# Altium footprint library ESKDPcbLib.PcbLib: 608 footprints (part 36 of 38)
Each footprint in its own frame and in the unit in brackets; x right, y up, seen from the top. Pads: shape width x height; smd on the part's side, far side on the other; paste and mask are expansions set on the pad; w line width, h text height; cw(c..) or ccw(c..) is an arc to the next point about the centre after c.
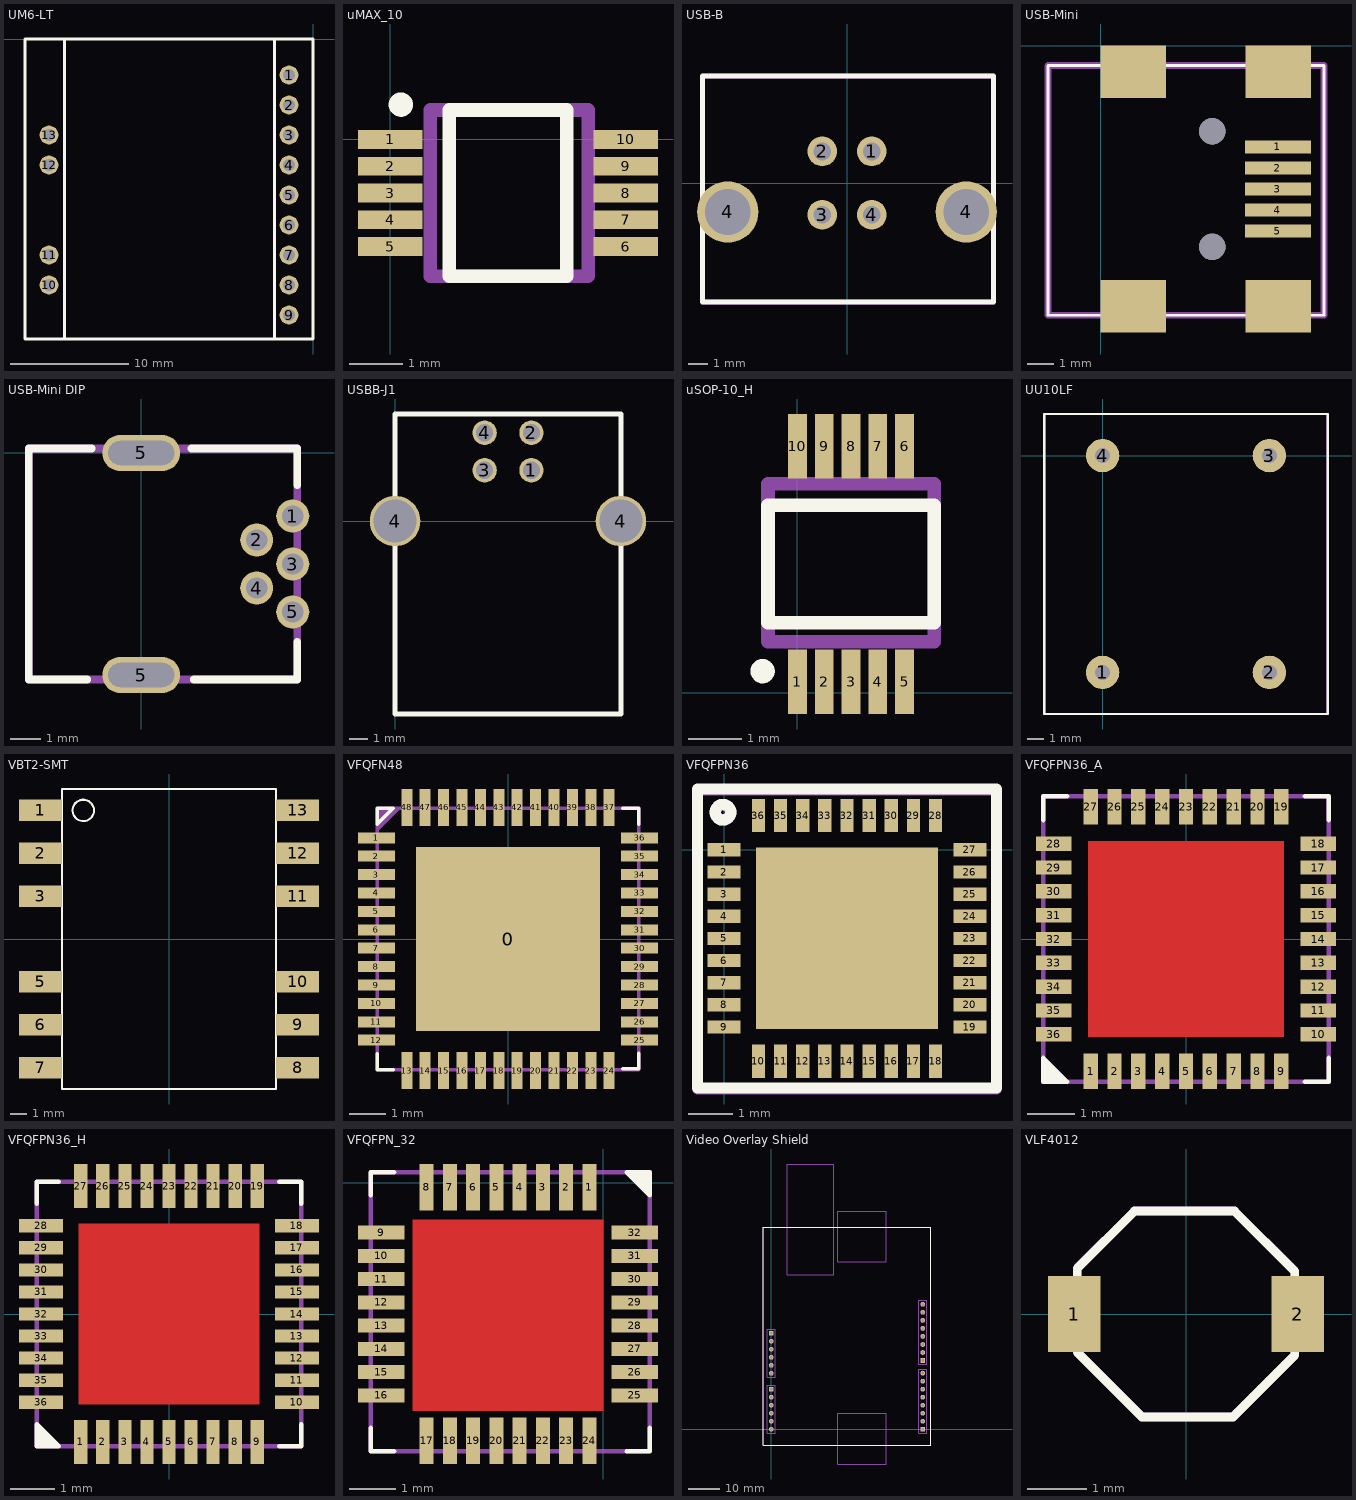
[diagram p35: the footprints below, top view; thin cyan lines are the x and y axes]

## UM6-LT [mm]
pads (13):
  round 1.6 hole 1 mask+0: 1(-2.032,-3.048) 2(-2.032,-5.588) 3(-2.032,-8.128) 4(-2.032,-10.668) 5(-2.032,-13.208) 6(-2.032,-15.748) 7(-2.032,-18.288) 8(-2.032,-20.828) 9(-2.032,-23.368) 10(-22.352,-20.828) 11(-22.352,-18.288) 12(-22.352,-10.668) 13(-22.352,-8.128)
Top Overlay:
  lines w0.254: -21.05,-25.4 -21.05,0 ; -3.27,-25.4 -3.27,0 ; -24.384,-25.4 -24.384,0 0,0 0,-25.4 -24.384,-25.4
3D body: height 8, standoff 2, extent -24.384,-25.4 0,0

## uMAX_10 [mm]
pads (10):
  rect 1.2x0.35 smd mask+0: 1(0,0) 2(0,-0.5) 3(0,-1) 4(0,-1.5) 5(0,-2) 6(4.4,-2) 7(4.4,-1.5) 8(4.4,-1) 9(4.4,-0.5) 10(4.4,0)
Top Overlay:
  circle w0.254: c0.2,0.65 r0.1
  lines w0.254: 1.1,-2.55 1.1,0.55 3.3,0.55 3.3,-2.55 1.1,-2.55
Mechanical 7:
  lines w0.254: 0.75,-2.55 0.75,0.55 ; 0.8,-2.55 3.7,-2.55 3.7,0.55 0.8,0.55
3D body: height 0.95, standoff 0, extent -0.3,-2.5 4.7,0.5

## USB-B [mm]
pads (6):
  round 1.5 hole 0.9: 1(1.25,1.6) 2(-1.25,1.6) 3(-1.25,-1.6) 4(1.25,-1.6)
  round 3.1 hole 2.3: 4(-6.02,-1.46) 4(6.02,-1.46)
Top Overlay:
  lines w0.254: -7.3,-6 7.4,-6 7.4,5.4 -7.3,5.4 -7.3,-6
Mechanical 7:
  lines w0.254: -7.3,-6 7.4,-6 7.4,5.4 -7.3,5.4 -7.3,-6
Mechanical 10:
  text ".Designator" at -3.2,6.8 h1.52
  text ".Comment" at -2.6,8.6 h1.52
3D body "USB-B.stp": height 16, standoff -3.95, extent -7.3,-5.925 7.4,5.375

## USB-Mini [mm]
pads (11):
  rect 2.5x0.5 smd: 1(6.75,-3.85) 2(6.75,-4.65) 3(6.75,-5.45) 4(6.75,-6.25) 5(6.75,-7.05)
  rect 2.5x2 smd: ""(1.245,-9.906) ""(1.245,-0.991) ""(6.756,-9.906) ""(6.756,-0.991)
  round 1 hole 1 mask+0: ""(4.25,-7.65) ""(4.25,-3.25)
Top Overlay:
  lines w0.1: -2,-10.25 -2,-0.75 8.5,-0.75 8.5,-10.25 -2,-10.25
Mechanical 7:
  lines w0.254: -2,-10.25 8.5,-10.25 8.5,-0.75 -2,-0.75 -2,-10.25
3D body "USBmini_smt.stp": height 4, standoff -0.9, extent -2.06,-10.33 7.34,-0.67

## USB-Mini DIP [mm]
height 3.9
pads (7):
  round 1.1 hole 0.7: 1(5.05,-2.1) 2(3.85,-2.9) 3(5.05,-3.7) 4(3.85,-4.5) 5(5.05,-5.3)
  oval 2.6x1.2 hole 0.8 slot 2.2 at 0 deg: 5(0,-7.4) 5(0,0)
Top Overlay:
  lines w0.254: -1.8,-7.55 -3.75,-7.55 -3.75,0.15 -1.65,0.15 ; 1.675,0.15 5.2,0.15 5.2,-1.075 ; 1.75,-7.55 5.2,-7.55 5.2,-6.3
Mechanical 7:
  lines w0.254: -3.75,-7.55 -3.75,0.15 5.2,0.15 5.2,-7.55 -3.75,-7.55
3D body: height 3.9, standoff 0, extent -3.749,-7.549 5.199,0.149

## USBB-J1 [mm]
pads (6):
  round 1.3 hole 0.92: 1(7.27,2.71) 2(7.27,4.71) 3(4.77,2.71) 4(4.77,4.71)
  round 2.7 hole 2.3: 4(0,0) 4(12.04,0)
Top Overlay:
  lines w0.254: 12,5.71 0,5.71 0,-10.29 12.04,-10.29 12.04,5.71

## uSOP-10_H [mm]
pads (10):
  rect 0.35x1.2 smd mask+0: 1(0,0.2) 2(0.5,0.2) 3(1,0.2) 4(1.5,0.2) 5(2,0.2) 6(2,4.6) 7(1.5,4.6) 8(1,4.6) 9(0.5,4.6) 10(0,4.6)
Top Overlay:
  circle w0.254: c-0.65,0.4 r0.1
  lines w0.254: -0.55,1.3 -0.55,3.5 2.55,3.5 2.55,1.3 -0.55,1.3
Mechanical 7:
  lines w0.254: -0.55,0.95 2.55,0.95 ; -0.55,1 -0.55,3.9 2.55,3.9 2.55,1
3D body: height 1.15, standoff 0, extent -0.5,-0.05 2.5,4.85

## UU10LF [mm]
pads (4):
  round 2 hole 0.9: 1(0,-13) 2(10,-13) 3(10,0) 4(0,0)
Top Overlay:
  lines w0.15: -3.5,-15.5 -3.5,2.5 13.5,2.5 13.5,-15.5 -3.5,-15.5
Mechanical 7:
  lines w0.15: -3.5,-15.5 13.5,-15.5 13.5,2.5 -3.5,2.5 -3.5,-15.5
Mechanical 10:
  text ".Comment" at 9,3.5 h0.6
  text ".Designator" at 8.8,4.425 h0.8
3D body: height 23, standoff 0, extent -3.5,-15.5 13.5,2.5

## VBT2-SMT [mm]
pads (12):
  rect 2.54x1.27 smd: 1(-7.62,7.62) 2(-7.62,5.08) 3(-7.62,2.54) 5(-7.62,-2.54) 6(-7.62,-5.08) 7(-7.62,-7.62) 8(7.62,-7.62) 9(7.62,-5.08) 10(7.62,-2.54) 11(7.62,2.54) 12(7.62,5.08) 13(7.62,7.62)
Top Overlay:
  circle w0.127: c-5.08,7.62 r0.635
  lines w0.127: -6.35,-8.89 6.35,-8.89 6.35,8.89 -6.35,8.89 -6.35,-8.89

## VFQFN48 [mm]
height 1
pads (49):
  rect 5x5 smd: 0(0,0)
  rect 1x0.3 smd: 1(-3.575,2.75) 2(-3.575,2.25) 3(-3.575,1.75) 4(-3.575,1.25) 5(-3.575,0.75) 6(-3.575,0.25) 7(-3.575,-0.25) 8(-3.575,-0.75) 9(-3.575,-1.25) 10(-3.575,-1.75) 11(-3.575,-2.25) 12(-3.575,-2.75) 25(3.575,-2.75) 26(3.575,-2.25) 27(3.575,-1.75) 28(3.575,-1.25) 29(3.575,-0.75) 30(3.575,-0.25) 31(3.575,0.25) 32(3.575,0.75) 33(3.575,1.25) 34(3.575,1.75) 35(3.575,2.25) 36(3.575,2.75)
  rect 0.3x1 smd: 13(-2.75,-3.575) 14(-2.25,-3.575) 15(-1.75,-3.575) 16(-1.25,-3.575) 17(-0.75,-3.575) 18(-0.25,-3.575) 19(0.25,-3.575) 20(0.75,-3.575) 21(1.25,-3.575) 22(1.75,-3.575) 23(2.25,-3.575) 24(2.75,-3.575) 37(2.75,3.575) 38(2.25,3.575) 39(1.75,3.575) 40(1.25,3.575) 41(0.75,3.575) 42(0.25,3.575) 43(-0.25,3.575) 44(-0.75,3.575) 45(-1.25,3.575) 46(-1.75,3.575) 47(-2.25,3.575) 48(-2.75,3.575)
Top Overlay:
  lines w0.1: -3.55,-3.125 -3.55,-3.55 -3.125,-3.55 ; 3.125,-3.525 3.55,-3.525 3.55,-3.1 ; 3.125,3.55 3.55,3.55 3.55,3.125 ; -3.55,3.125 -3.55,3.55 -3.125,3.55 -3.55,3.125
Mechanical 7:
  lines w0.1: -3.546,2.979 -2.987,3.538 ; -3.542,3.108 -3.1,3.55 ; -3.542,3.208 -3.213,3.537 ; -3.542,3.396 -3.4,3.537 -3.375,3.512 ; -3.517,3.333 -3.338,3.512 ; -3.55,-3.55 -3.55,3.55 3.55,3.55 3.55,-3.55 -3.55,-3.55
Mechanical 10:
  text ".Comment" at -1.275,4.375 h0.6
  text ".Designator" at -1.225,-4.925 h0.6
3D body: height 1, standoff 0, extent -3.6,-3.6 3.6,3.6

## VFQFPN36 [mm]
pads (37):
  rect 0.75x0.3 smd: 1(0,0) 2(0,-0.5) 3(0,-1) 4(0,-1.5) 5(0,-2) 6(0,-2.5) 7(0,-3) 8(0,-3.5) 9(0,-4) 19(5.55,-4) 20(5.55,-3.5) 21(5.55,-3) 22(5.55,-2.5) 23(5.55,-2) 24(5.55,-1.5) 25(5.55,-1) 26(5.55,-0.5) 27(5.55,0)
  rect 0.3x0.75 smd: 10(0.775,-4.775) 11(1.275,-4.775) 12(1.775,-4.775) 13(2.275,-4.775) 14(2.775,-4.775) 15(3.275,-4.775) 16(3.775,-4.775) 17(4.275,-4.775) 18(4.775,-4.775) 28(4.775,0.775) 29(4.275,0.775) 30(3.775,0.775) 31(3.275,0.775) 32(2.775,0.775) 33(2.275,0.775) 34(1.775,0.775) 35(1.275,0.775) 36(0.775,0.775)
  rect 4.1x4.1 smd: ""(2.775,-2)
Top Overlay:
  circle w0.254: c-0.025,0.85 r0.175
  lines w0.25: -0.6,-5.375 6.15,-5.375 6.15,1.375 -0.6,1.375 -0.6,-5.375
Mechanical 7:
  circle w0.254: c-0.025,0.85 r0.175
  lines w0.25: -0.6,-5.4 -0.6,1.35 6.15,1.35 6.15,-5.4 -0.6,-5.4
3D body: height 1, standoff 0.05, extent -0.287,-5.062 5.838,1.063

## VFQFPN36_A [mm]
height 1
pads (36):
  rect 0.3x0.75 smd mask+0: 1(-2,-2.775) 2(-1.5,-2.775) 3(-1,-2.775) 4(-0.5,-2.775) 5(0,-2.775) 6(0.5,-2.775) 7(1,-2.775) 8(1.5,-2.775) 9(2,-2.775) 19(2,2.775) 20(1.5,2.775) 21(1,2.775) 22(0.5,2.775) 23(0,2.775) 24(-0.5,2.775) 25(-1,2.775) 26(-1.5,2.775) 27(-2,2.775)
  rect 0.75x0.3 smd mask+0: 10(2.775,-2) 11(2.775,-1.5) 12(2.775,-1) 13(2.775,-0.5) 14(2.775,0) 15(2.775,0.5) 16(2.775,1) 17(2.775,1.5) 18(2.775,2) 28(-2.775,2) 29(-2.775,1.5) 30(-2.775,1) 31(-2.775,0.5) 32(-2.775,0) 33(-2.775,-0.5) 34(-2.775,-1) 35(-2.775,-1.5) 36(-2.775,-2)
Top Layer:
  region: -2.05,2.05 2.05,2.05 2.05,-2.05 -2.05,-2.05
Top Overlay:
  region: -3,-3 -2.5,-3 -3,-2.5
  lines w0.1: -3,2.5 -3,3 -2.5,3 ; 2.5,-3 3,-3 3,-2.5 ; 2.5,3 3,3 3,2.5 ; -3,-3 -3,-2.5 -2.5,-3 -3,-3
Mechanical 7:
  lines w0.1: -3,-3 3,-3 3,3 -3,3 -3,-3
Mechanical 10:
  text ".Comment" at -1,-3.875 h0.6
  text ".Designator" at -1.075,3.6 h0.8
3D body: height 1, standoff 0, extent -3,-3 3,3

## VFQFPN36_H [mm]
height 1
pads (36):
  rect 0.3x1 smd mask+0: 1(-2,-2.9) 2(-1.5,-2.9) 3(-1,-2.9) 4(-0.5,-2.9) 5(0,-2.9) 6(0.5,-2.9) 7(1,-2.9) 8(1.5,-2.9) 9(2,-2.9) 19(2,2.9) 20(1.5,2.9) 21(1,2.9) 22(0.5,2.9) 23(0,2.9) 24(-0.5,2.9) 25(-1,2.9) 26(-1.5,2.9) 27(-2,2.9)
  rect 1x0.3 smd mask+0: 10(2.9,-2) 11(2.9,-1.5) 12(2.9,-1) 13(2.9,-0.5) 14(2.9,0) 15(2.9,0.5) 16(2.9,1) 17(2.9,1.5) 18(2.9,2) 28(-2.9,2) 29(-2.9,1.5) 30(-2.9,1) 31(-2.9,0.5) 32(-2.9,0) 33(-2.9,-0.5) 34(-2.9,-1) 35(-2.9,-1.5) 36(-2.9,-2)
Top Layer:
  region: -2.05,2.05 2.05,2.05 2.05,-2.05 -2.05,-2.05
Top Overlay:
  region: -3,-3 -2.5,-3 -3,-2.5
  lines w0.1: -3,2.5 -3,3 -2.5,3 ; 2.5,-3 3,-3 3,-2.5 ; 2.5,3 3,3 3,2.5 ; -3,-3 -3,-2.5 -2.5,-3 -3,-3
Mechanical 7:
  lines w0.1: -3,-3 3,-3 3,3 -3,3 -3,-3
Mechanical 10:
  text ".Comment" at -1,-3.875 h0.6
  text ".Designator" at -1.05,3.6 h0.8
3D body: height 1, standoff 0, extent -3,-3 3,3

## VFQFPN_32 [mm]
pads (32):
  rect 0.3x1 smd mask+0: 1(-0.3,-0.1) 2(-0.8,-0.1) 3(-1.3,-0.1) 4(-1.8,-0.1) 5(-2.3,-0.1) 6(-2.8,-0.1) 7(-3.3,-0.1) 8(-3.8,-0.1) 17(-3.8,-5.55) 18(-3.3,-5.55) 19(-2.8,-5.55) 20(-2.3,-5.55) 21(-1.8,-5.55) 22(-1.3,-5.55) 23(-0.8,-5.55) 24(-0.3,-5.55)
  rect 1x0.3 smd mask+0: 9(-4.775,-1.075) 10(-4.775,-1.575) 11(-4.775,-2.075) 12(-4.775,-2.575) 13(-4.775,-3.075) 14(-4.775,-3.575) 15(-4.775,-4.075) 16(-4.775,-4.575) 25(0.675,-4.575) 26(0.675,-4.075) 27(0.675,-3.575) 28(0.675,-3.075) 29(0.675,-2.575) 30(0.675,-2.075) 31(0.675,-1.575) 32(0.675,-1.075)
Top Layer:
  region: -4.1,-0.8 0,-0.8 0,-4.9 -4.1,-4.9
Top Overlay:
  region: 1,0.225 0.5,0.225 1,-0.275
  lines w0.1: -5,-5.275 -5,-5.775 -4.5,-5.775 ; -5,-0.275 -5,0.225 -4.5,0.225 ; 0.5,-5.775 1,-5.775 1,-5.275 ; 0.5,0.225 1,0.225 1,-0.275 0.5,0.225
Mechanical 7:
  lines w0.1: -5,-5.775 1,-5.775 1,0.225 -5,0.225 -5,-5.775
Mechanical 10:
  text ".Comment" at -3.302,-6.604 h0.6
  text ".Designator" at -3.302,0.762 h0.6
3D body: height 1, standoff 0, extent -4.55,-5.275 0.45,-0.275

## Video Overlay Shield [mm]
pads (28):
  rect 1.5x1.5 hole 0.9: 1(0,30.4) 7(0,12.7) 13(48,0) 21(48,21.775)
  round 1.5 hole 0.9: 2(0,27.86) 3(0,25.32) 4(0,22.78) 5(0,20.24) 6(0,17.7) 8(0,10.16) 9(0,7.62) 10(0,5.08) 11(0,2.54) 12(0,0) 14(48,2.54) 15(48,5.08) 16(48,7.62) 17(48,10.16) 18(48,12.7) 19(48,15.24) 20(48,17.78) 22(48,24.315) 23(48,26.855) 24(48,29.395) 25(48,31.935) 26(48,34.475) 27(48,37.015) 28(48,39.555)
Top Overlay:
  lines w0.15: -2.5,-5 50.5,-5 50.5,64 -2.5,64 -2.5,-5
Mechanical 7:
  lines w0.1: -2.5,-5 -2.5,64 50.5,64 50.5,-5 -2.5,-5 ; -1.3,-1.2 1.3,-1.2 1.3,14 -1.3,14 -1.3,-1.2 ; -1.3,16.5 -1.3,31.7 1.3,31.7 1.3,16.5 -1.3,16.5 ; 5,49 19.8,49 19.8,84 5,84 5,49 ; 21,-11 21,5 36.5,5 36.5,-11 21,-11 ; 21,53 36.5,53 36.5,69 21,69 21,53 ; 46.7,-1.2 49.3,-1.2 49.3,19 46.7,19 46.7,-1.2 ; 46.7,20.575 49.3,20.575 49.3,40.9 46.7,40.9 46.7,20.575
3D body: height 11, standoff 3, extent 46.7,20.575 49.3,40.9
3D body: height 11, standoff 3, extent 46.7,-1.2 49.3,19
3D body: height 11, standoff 3, extent -1.3,-1.2 1.3,14
3D body: height 11, standoff 3, extent -1.3,16.5 1.3,31.7
3D body: height 3, standoff 1.5, extent -2.5,-5 50.5,64
3D body: height 15, standoff 3, extent 21,-11 36.5,5
3D body: height 15, standoff 3, extent 20.9,52.9 36.5,69
3D body: height 16, standoff 3, extent 4.9,49 19.8,84

## VLF4012 [mm]
pads (2):
  rect 0.9x1.3 smd: 1(-1.9,0) 2(1.9,0)
Top Overlay:
  lines w0.15: -1.85,-0.65 -0.75,-1.75 0.8,-1.75 1.85,-0.7 1.85,0.725 0.825,1.75 -0.875,1.75 -1.85,0.775 -1.85,-0.65
Mechanical 7:
  lines w0.15: -1.85,-0.65 -1.85,0.775 -0.875,1.75 0.825,1.75 1.85,0.725 1.85,-0.7 0.8,-1.75 -0.75,-1.75 -1.85,-0.65
3D body: height 1.2, standoff 0, extent -1.925,-1.825 1.95,1.825